# Altium integrated library Transistor-SMD_V2.IntLib: 415 symbols (part 1 of 2) (continued)
## CSD16414Q5_SON8 (continued)

## CSD17313Q2_SON6
designator Q?, comment CSD17313Q2
FET N-Channel 34A 25V; Manufacturer: Texas; Package: SON6-2x2-EP2; EDM-PN: *; Text2: *; Text1: *; Value: CSD17313Q2; SAAB PN: *; Part Number: CSD17313Q2; DCE Part No: *
footprint SON6-2x2-EP2 (SON6 2.0x2.0mm)
pins: 1 D, 2 D, 3 G, 4 S, 5 D, 6 D, 7 S, 8 D

## CSD17551Q3A_VSONP8
designator Q?, comment CSD17551Q3A
FET N-Channel 12A 30V; Manufacturer: Texas; Package: VSONP8-3x3-DNH; EDM-PN: *; Text2: *; Text1: *; Value: CSD17551Q3A; SAAB PN: *; Part Number: CSD17551Q3A; DCE Part No: *
footprint VSONP8-3x3-DNH (VSONP8 8 3.0x3.0mm)
pins: 1 S, 2 S, 3 S, 4 G, 5 D, 6 D, 7 D, 8 D, 9 D

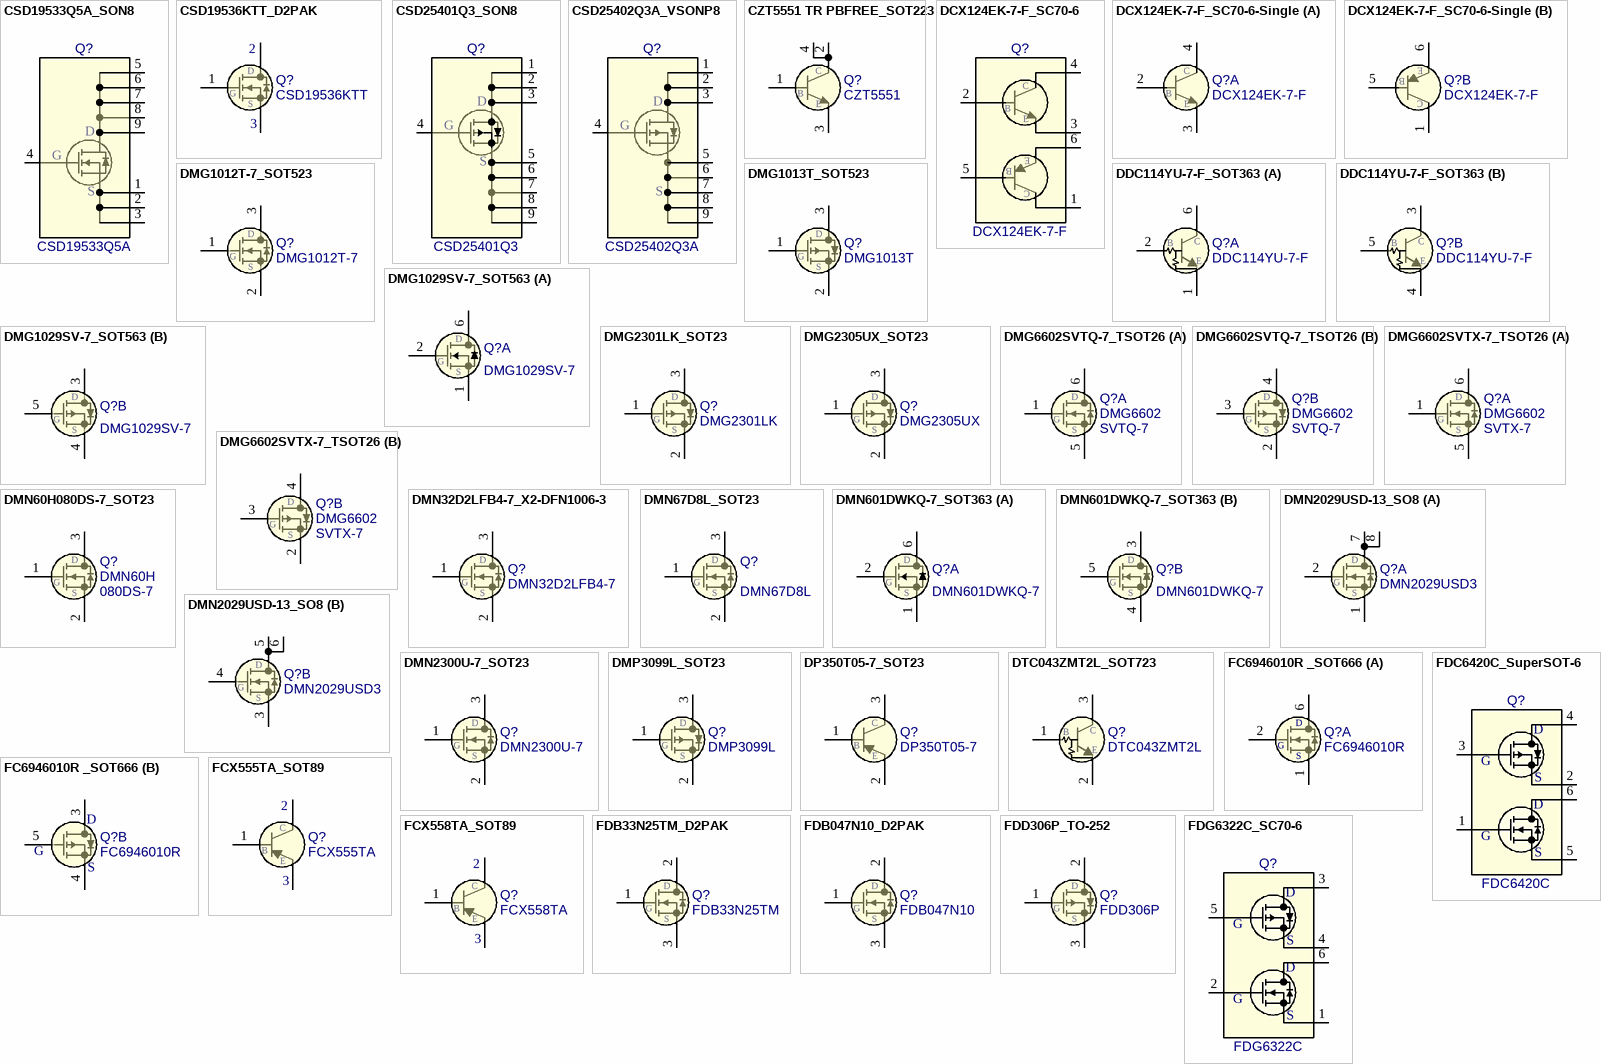
[diagram p3: symbols CSD19533Q5A_SON8 to FDG6322C_SC70-6]

## CSD19533Q5A_SON8
designator Q?, comment CSD19533Q5A
FET N-Channel 13A 100V; Manufacturer: Texas; Package: SON8-6x5-EP; EDM-PN: *; Text2: *; Text1: *; Value: CSD19533Q5A; SAAB PN: *; Part Number: CSD19533Q5A; DCE Part No: *
footprint SON8-5x6-EP (SON 8 6.1x5.1mm)
pins: 1 S, 2 S, 3 S, 4 G, 5 D, 6 D, 7 D, 8 D, 9 D

## CSD19536KTT_D2PAK
designator Q?, comment CSD19536KTT
FET N-Channel 200A 100V; Manufacturer: Texas; Reutech PN: 5961-FE-0102; Package: D2PAK; EDM-PN: *; Text2: *; Text1: *; Value: CSD19536KTT; SAAB PN: *; Part Number: CSD19536KTT; DCE Part No: *
footprint TO-263-KTT (TO-263, 3-Pads, Body 9.4x10.4mm (max), IPC Medium Density)
pins: 1 G, 2 D, 3 S

## CSD25401Q3_SON8
designator Q?, comment CSD25401Q3
FET P-Channel 14A 20V; Manufacturer: Texas; Package: SON8-3.3x3.3-EP; EDM-PN: *; Text2: *; Text1: *; Value: CSD25401Q3; SAAB PN: *; Part Number: CSD25401Q3; DCE Part No: *
footprint SON8-3.3x3.3-EP (SON 8 3.3x3.3mm)
pins: 1 S, 2 S, 3 S, 4 G, 5 D, 6 D, 7 D, 8 D, 9 D

## CSD25402Q3A_VSONP8
designator Q?, comment CSD25402Q3A
FET P-Channel 76A 20V; Manufacturer: Texas; Package: VSONP8-3x3-DNH; EDM-PN: *; Text2: *; Text1: *; Value: CSD25402Q3A; SAAB PN: *; Part Number: CSD25402Q3A; DCE Part No: *
footprint VSONP8-3x3-DNH (VSONP8 8 3.0x3.0mm)
pins: 1 D, 2 D, 3 D, 4 G, 5 S, 6 S, 7 S, 8 S, 9 S

## CZT5551 TR PBFREE_SOT223
designator Q?, comment value CZT5551  (hidden comment: CZT5551 TR PBFREE)
Transistor NPN 160V 600mA; Manufacturer: Central Semi; Package: SOT223; EDM-PN: *; Text2: *; Text1: *; SAAB PN: *; Part Number: CZT5551 TR PBFREE; DCE Part No: *
footprint SOT223 (SOT223, 4-Leads, Body 6.7x7.3mm (max), Pitch 2.30mm, IPC Medium Density)
pins: 1 B, 2 C, 3 E, 4 C

## DCX124EK-7-F_SC70-6
designator Q?, comment DCX124EK-7-F
Transistor NPN/PNP Prebias 0.1A 50V; Manufacturer: Diodes; Package: SC74-6-REV; EDM-PN: *; Text2: *; Text1: *; Value: DCX124EK-7-F; SAAB PN: *; Part Number: DCX124EK-7-F; DCE Part No: *
footprint SC74-6-REV (SC74-6 1.7x3.1mm)
pins: 1, 2, 3, 4, 5, 6
text: C; B; E

## DCX124EK-7-F_SC70-6-Single
designator Q?, comment DCX124EK-7-F
Transistor NPN/PNP Prebias 0.1A 50V; Manufacturer: Diodes; Package: SC70-6-REV; EDM-PN: *; Text2: *; Text1: *; Value: DCX124EK-7-F; SAAB PN: *; Part Number: DCX124EK-7-F; DCE Part No: *
footprint SC74-6-REV (SC74-6 1.7x3.1mm)
part A pins: 2, 3, 4
part B pins: 1, 5, 6
part A text: C; B; E
part B text: E; B; C

## DDC114YU-7-F_SOT363
designator Q?, comment DDC114YU-7-F
Transistor Dual NPN Prebias 50V 200mA 10K-47K; Manufacturer: Diodes; Package: SOT363-6-D; EDM-PN: *; Text2: *; Text1: *; Value: DDC114YU-7-F; SAAB PN: *; Part Number: DDC114YU-7-F; DCE Part No: *
footprint SOT363-6-D (SOT363 1.35x2.2mm 6lead)
part A pins: 1 E1, 2 B1, 6 C1
part B pins: 3 C2, 4 E2, 5 B2
part A text: B; C; E
part B text: B; C; E

## DMG1012T-7_SOT523
designator Q?, comment DMG1012T-7
FET N-Channel 20V 450mA; Manufacturer: Diodes Inc; Package: SOT523; EDM-PN: *; Text2: *; Text1: *; Value: DMG1012T-7; SAAB PN: *; Part Number: DMG1012T-7; DCE Part No: *
footprint SOT523 (SOT523 1.7x0.85mm)
pins: 1 G, 2 S, 3 D

## DMG1013T_SOT523
designator Q?, comment DMG1013T
FET P-Channel 20V 400mA; Manufacturer: Diodes Inc; Package: SOT523; EDM-PN: *; Text2: *; Text1: *; Value: DMG1013T; Part Number: DMG1013T; SAAB PN: *; DCE Part No: *
footprint SOT523 (SOT523 1.7x0.85mm)
pins: 1 G, 2 S, 3 D

## DMG1029SV-7_SOT563
designator Q?, comment DMG1029SV-7
FET Dual N/P-Channel 60V 500/360mA; Manufacturer: Diodes; Package: SOT563-6; EDM-PN: *; Text2: *; Text1: *; Part Number: DMG1029SV-7; SAAB PN: *; Value: DMG1029SV-7; DCE Part No: *
footprint SOT563-6 (SOT563-6 1.2x1.6mm)
part A pins: 1 S1, 2 G1, 6 D1
part B pins: 3 D2, 4 S2, 5 G2
part A text: D; G; S
part B text: D; G; S

## DMG2301LK_SOT23
designator Q?, comment DMG2301LK
FET P-Channel 20V 2.4A; Manufacturer: Diodes; Package: SOT23; EDM-PN: *; Text2: *; Text1: *; Value: DMG2301LK; SAAB PN: *; Part Number: DMG2301LK; DCE Part No: *
footprint SOT23 (SOT23, 3-Leads, Body 3.0x1.4mm (max), Pitch 0.95mm, IPC Medium Density)
pins: 1 G, 2 S, 3 D

## DMG2305UX_SOT23
designator Q?, comment DMG2305UX
FET P-Channel 3.6A 20V; Manufacturer: Diodes; Package: SOT23; EDM-PN: *; Text2: *; Text1: *; Value: DMG2305UX; SAAB PN: *; Part Number: DMG2305UX; DCE Part No: *
footprint SOT23 (SOT23, 3-Leads, Body 3.0x1.4mm (max), Pitch 0.95mm, IPC Medium Density)
pins: 1 G, 2 S, 3 D

## DMG6602SVTQ-7_TSOT26
designator Q?, comment Text2: SVTQ-7  Text1: DMG6602  (hidden comment: DMG6602SVTQ-7)
FET Dual N & P-Channel 30V 3.4/2.8A; Manufacturer: Diodes; Package: TSOT26; EDM-PN: *; Value: DMG6602SVTQ-7; SAAB PN: *; Part Number: DMG6602SVTQ-7; DCE Part No: *
footprint TSOT26 (TSOT26, 6-Leads, 1.6x2.9mm)
part A pins: 1 G1, 5 S1, 6 D1
part B pins: 2 S2, 3 G2, 4 D2
part A text: D; G; S
part B text: D; G; S

## DMG6602SVTX-7_TSOT26
designator Q?, comment Text2: SVTX-7  Text1: DMG6602  (hidden comment: DMG6602SVTX-7)
FET Dual N & P-Channel 30V 3.4/2.8A Complementary; Manufacturer: Diodes; Package: TSOT26; EDM-PN: *; Value: DMG6602SVTX-7; SAAB PN: *; Part Number: DMG6602SVTX-7; DCE Part No: *
footprint TSOT26 (TSOT26, 6-Leads, 1.6x2.9mm)
part A pins: 1 G1, 5 S1, 6 D1
part B pins: 2 S2, 3 G2, 4 D2
part A text: D; G; S
part B text: D; G; S

## DMN32D2LFB4-7_X2-DFN1006-3
designator Q?, comment DMN32D2LFB4-7
FET N-Channel 30V 300mA; Manufacturer: Diodes; Package: X2-DFN1006-3; EDM-PN: *; Text2: *; Text1: *; Value: DMN32D2LFB4-7; SAAB PN: *; DCE Part No: *; Part Number: DMN32D2LFB4-7
footprint X2-DFN1006-3 (DFN1006-3 0.6x1.0mm)
pins: 1 G, 2 S, 3 D

## DMN60H080DS-7_SOT23
designator Q?, comment Text2: 080DS-7  Text1: DMN60H  (hidden comment: DMN60H080DS-7)
FET N-Channel 600V 80mA; Manufacturer: Diodes; Package: SOT23; EDM-PN: *; Value: DMN60H080DS-7; SAAB PN: *; Part Number: DMN60H080DS-7; DCE Part No: *
footprint SOT23 (SOT23, 3-Leads, Body 3.0x1.4mm (max), Pitch 0.95mm, IPC Medium Density)
pins: 1 G, 2 S, 3 D

## DMN67D8L_SOT23
designator Q?, comment DMN67D8L
FET N-Channel 60V 210mA; Manufacturer: Diodes; Package: SOT23; EDM-PN: *; SAAB PN: *; Part Number: DMN67D8L; Text2: *; Text1: *; Value: DMN67D8L; DCE Part No: *
footprint SOT23 (SOT23, 3-Leads, Body 3.0x1.4mm (max), Pitch 0.95mm, IPC Medium Density)
pins: 1 G, 2 S, 3 D

## DMN601DWKQ-7_SOT363
designator Q?, comment DMN601DWKQ-7
FET Dual N-Channel 60V 305mA; Manufacturer: Diodes; Package: SOT363-6; EDM-PN: *; Text2: *; Text1: *; Part Number: DMN601DWKQ-7; SAAB PN: *; DCE Part No: *; Value: DMN601DWKQ-7
footprint SOT363-6 (SOT363 1.35x2.2mm 6lead)
part A pins: 1 S1, 2 G1, 6 D1
part B pins: 3 D2, 4 S2, 5 G2
part A text: D; G; S
part B text: D; G; S

## DMN2029USD-13_SO8
designator Q?, comment value DMN2029USD3  (hidden comment: DMN2029USD-13)
FET Dual N-Channel 20V 4.8A; Manufacturer: Diodes; Package: SO8; EDM-PN: *; Text2: *; Text1: *; SAAB PN: *; Part Number: DMN2029USD-13; DCE Part No: *
footprint SO8 (SOIC, 8-Leads, Body 5.0x4.0mm (max), Pitch 1.27mm, IPC Medium Density)
part A pins: 1 S1, 2 G1, 7 D1, 8 D2
part B pins: 3 S2, 4 G2, 5 D2, 6 D2
part A text: D; G; S
part B text: D; G; S

## DMN2300U-7_SOT23
designator Q?, comment DMN2300U-7
FET N-Channel 1.24A 20V; Manufacturer: Diodes; Package: SOT23; EDM-PN: *; Text2: *; Text1: *; Value: DMN2300U-7; SAAB PN: *; Part Number: DMN2300U-7; DCE Part No: *
footprint SOT23 (SOT23, 3-Leads, Body 3.0x1.4mm (max), Pitch 0.95mm, IPC Medium Density)
pins: 1 G, 2 S, 3 D

## DMP3099L_SOT23
designator Q?, comment DMP3099L
FET P-Channel 3.0A 30V; Manufacturer: Diodes; Package: SOT23; EDM-PN: *; Text2: *; Text1: *; Value: DMP3099L; SAAB PN: *; Part Number: DMP3099L; DCE Part No: *
footprint SOT23 (SOT23, 3-Leads, Body 3.0x1.4mm (max), Pitch 0.95mm, IPC Medium Density)
pins: 1 G, 2 S, 3 D

## DP350T05-7_SOT23
designator Q?, comment DP350T05-7
Transistor PNP 350V 500mA; Manufacturer: Diodes; Package: SOT23; EDM-PN: *; Text2: *; Text1: *; SAAB PN: *; Part Number: DP350T05-7; Value: DP350T05-7; DCE Part No: *
footprint SOT23 (SOT23, 3-Leads, Body 3.0x1.4mm (max), Pitch 0.95mm, IPC Medium Density)
pins: 1 B, 2 E, 3 C

## DTC043ZMT2L_SOT723
designator Q?, comment DTC043ZMT2L
Transistor NPN Prebias 50V 100mA 4K7-47K; Manufacturer: ROHM; Package: SOT723; EDM-PN: *; Text2: *; Text1: *; Value: DTC043ZMT2L; SAAB PN: *; Part Number: DTC043ZMT2L; DCE Part No: *
footprint SOT723 (SOT723 1.2x0.8mm)
pins: 1 G, 2 S, 3 D
text: B; C; E

## FC6946010R _SOT666
designator Q?, comment FC6946010R
FET N-Channel Dual 100mA 60V; Manufacturer: Panasonic; Package: SOT666; EDM-PN: *; Text2: *; Text1: *; Value: FC6946010R; SAAB PN: *; Part Number: FC6946010R; DCE Part No: *
footprint SOT666 (SOT666 1.3x1.7mm)
part A pins: 1 S-1, 2 G-1, 6 D-1
part B pins: 3 D-2, 4 S-2, 5 G-2
part A text: D; G; S
part B text: D; G; S

## FCX555TA_SOT89
designator Q?, comment FCX555TA
Transistor PNP High Voltage; Manufacturer: Zetex; Reutech PN: 5961-PN-0030; Package: SOT89; EDM-PN: *; Text2: *; Text1: *; Value: FCX555TA; SAAB PN: *; Part Number: FCX555TA; DCE Part No: *
footprint SOT89 (SOT89 4.5x2.45mm)
pins: 1 B, 2 C, 3 E

## FCX558TA_SOT89
designator Q?, comment FCX558TA
Transistor PNP High Voltage 200mA 400V; Manufacturer: Zetex; Package: SOT89; EDM-PN: *; Text2: *; Text1: *; Value: FCX558TA; Reutech PN: *; SAAB PN: *; Part Number: FCX558TA; DCE Part No: *
footprint SOT89 (SOT89 4.5x2.45mm)
pins: 1 B, 2 C, 3 E

## FDB33N25TM_D2PAK
designator Q?, comment FDB33N25TM
FET N-Channel 33A 250V; Manufacturer: Fairchild; Package: D2PAK; EDM-PN: *; Text2: *; Text1: *; Value: FDB33N25TM; SAAB PN: *; Part Number: FDB33N25TM; DCE Part No: *
footprint D2PAK (D2-PAK, 3-Pads, Body 9.4x10.4mm (max), IPC Medium Density)
pins: 1 G, 2 D, 3 S

## FDB047N10_D2PAK
designator Q?, comment FDB047N10
FET N-Channel 164A 100V; Manufacturer: Fairchild; Package: D2PAK; EDM-PN: *; Text2: *; Text1: *; Value: FDB047N10; SAAB PN: *; Part Number: FDB047N10; DCE Part No: *
footprint D2PAK (D2-PAK, 3-Pads, Body 9.4x10.4mm (max), IPC Medium Density)
pins: 1 G, 2 D, 3 S

## FDC6420C_SuperSOT-6
designator Q?, comment FDC6420C
FET N & P-Channel 2.2A 20V; Manufacturer: Fairchild; Package: SuperSOT-6; EDM-PN: *; Text2: *; Text1: *; Value: FDC6420C; SAAB PN: *; Part Number: FDC6420C; DCE Part No: *
footprint SUPERSOT-6 (SuperSot-6 1.7X3.0mm)
pins: 1 G-2, 2 S-1, 3 G-1, 4 D-1, 5 S-2, 6 D-2
text: D; G; S

## FDD306P_TO-252
designator Q?, comment FDD306P
FET P-Channel 6.7A 12V; Manufacturer: Fairchild; Package: TO-252; EDM-PN: *; Text2: *; Text1: *; Value: FDD306P; SAAB PN: *; Part Number: FDD306P; DCE Part No: *
footprint TO-252 (TO-252 6.58x6.1mm)
pins: 1 G, 2 D, 3 S

## FDG6322C_SC70-6
designator Q?, comment FDG6322C
FET N & P-Channel 0.2/0.4A 25V; Manufacturer: Fairchild; Package: SC70-6; EDM-PN: *; Text2: *; Text1: *; Value: FDG6322C; SAAB PN: *; Part Number: FDG6322C; DCE Part No: *
footprint SC70-6 (SC70, 6-Leads, Body 2.2x1.4mm (max), Pitch 0.65mm, IPC Medium Density)
pins: 1 S-1, 2 G-1, 3 D-2, 4 S-2, 5 G-2, 6 D-1
text: D; G; S

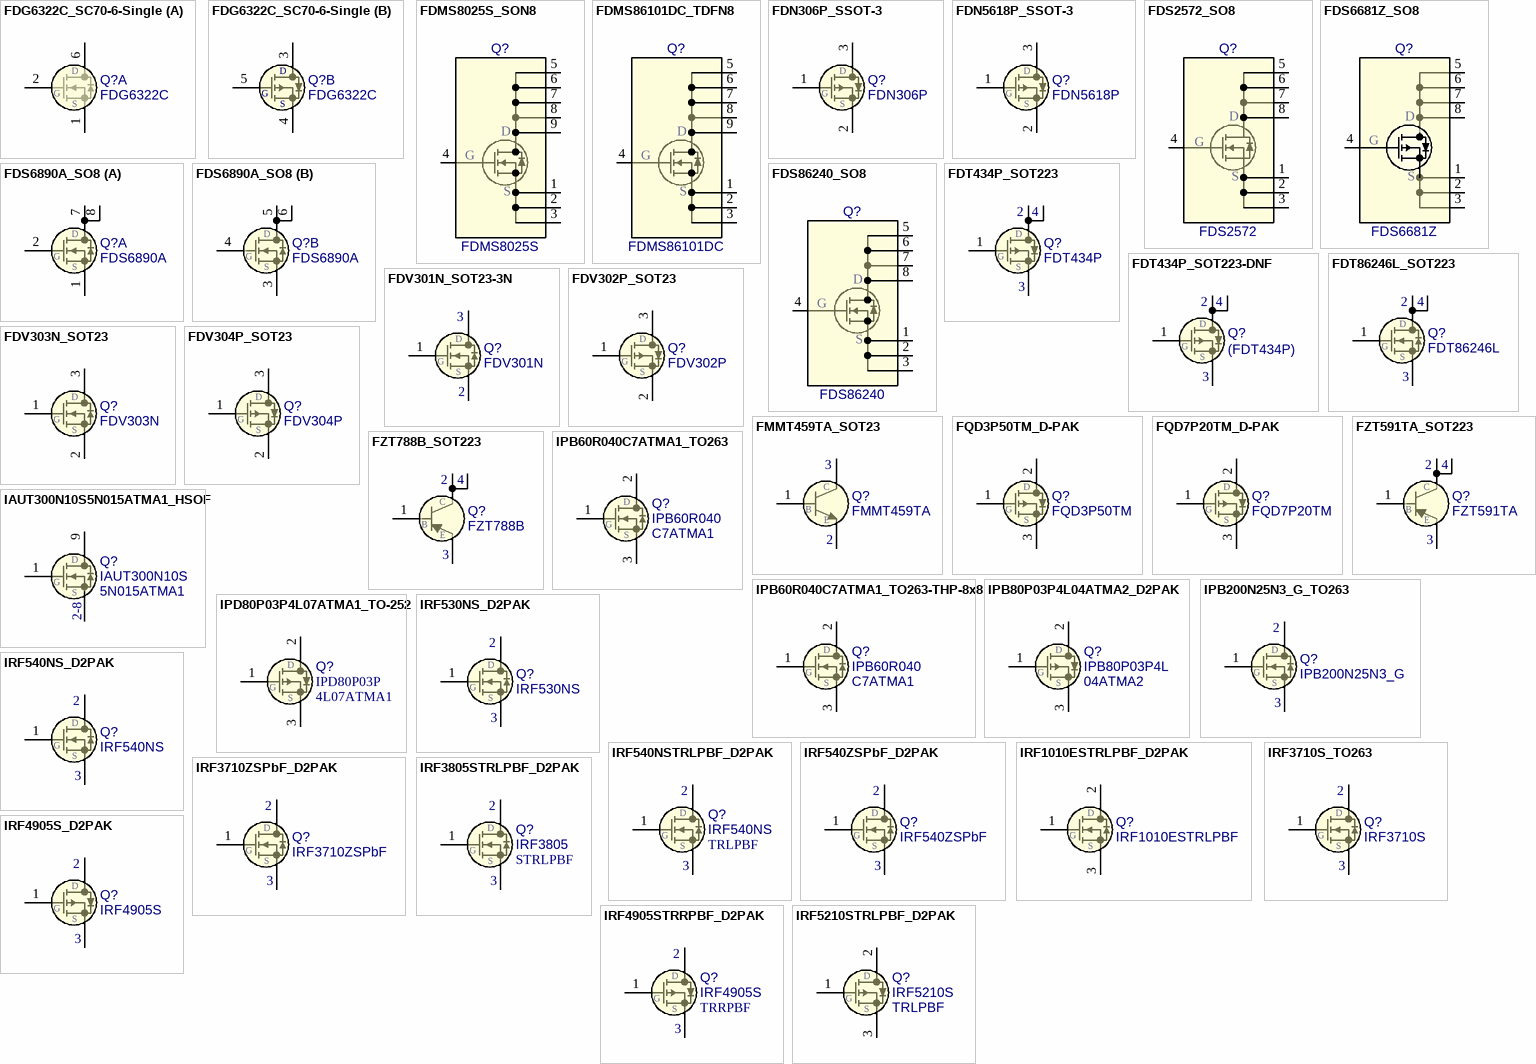
[diagram p4: symbols FDG6322C_SC70-6-Single to IRF5210STRLPBF_D2PAK]

## FDG6322C_SC70-6-Single
designator Q?, comment FDG6322C
FET N & P-Channel 0.2/0.4A 25V; Manufacturer: Fairchild; Package: SC70-6; EDM-PN: *; Text2: *; Text1: *; Value: FDG6322C; SAAB PN: *; Part Number: FDG6322C; DCE Part No: *
footprint SC70-6 (SC70, 6-Leads, Body 2.2x1.4mm (max), Pitch 0.65mm, IPC Medium Density)
part A pins: 1 S-1, 2 G-1, 6 D-1
part B pins: 3 D-2, 4 S-2, 5 G-2
part A text: D; G; S
part B text: D; G; S

## FDMS8025S_SON8
designator Q?, comment FDMS8025S
FET N-Channel 49A 30V; Manufacturer: Fairchild; Package: SON8-6x5-EP; EDM-PN: *; Text2: *; Text1: *; Value: FDMS8025S; SAAB PN: *; Part Number: FDMS8025S; DCE Part No: *
footprint SON8-5x6-EP (SON 8 6.1x5.1mm)
pins: 1 S, 2 S, 3 S, 4 G, 5 D, 6 D, 7 D, 8 D, 9 D

## FDMS86101DC_TDFN8
designator Q?, comment FDMS86101DC
FET N-Channel 14.5A 100V; Manufacturer: Fairchild; EDM-PN: FET149; Package: TDFN8-6x5-POWER; Text2: *; Text1: *; Value: FDMS86101DC; SAAB PN: *; Part Number: FDMS86101DC; DCE Part No: *
footprint TDFN8-6x5-POWER (TDFN8-6x5-POWER 6.1x5.1mm)
pins: 1 S, 2 S, 3 S, 4 G, 5 D, 6 D, 7 D, 8 D, 9 D

## FDN306P_SSOT-3
designator Q?, comment FDN306P
FET P-Channel 2.6A 12V; Manufacturer: On Semi; EDM-PN: FET145; Package: SuperSOT-3; Text2: *; Text1: *; Value: FDN306P; SAAB PN: *; Part Number: FDN306P; DCE Part No: *
footprint SuperSOT-3 (SuperSot-3 2.92x2.4mm)
pins: 1 G, 2 S, 3 D

## FDN5618P_SSOT-3
designator Q?, comment FDN5618P
FET P-Channel 1.25A 60V; Manufacturer: Fairchild; Package: SuperSOT-3; EDM-PN: *; Text2: *; Text1: *; Value: FDN5618P; SAAB PN: *; Part Number: FDN5618P; DCE Part No: *
footprint SuperSOT-3 (SuperSot-3 2.92x2.4mm)
pins: 1 G, 2 S, 3 D

## FDS2572_SO8
designator Q?, comment FDS2572
FET N-Channel 4.9A 150V; Manufacturer: Fairchild; Package: SO8; EDM-PN: *; Text2: *; Text1: *; Value: FDS2572; SAAB PN: *; Part Number: FDS2572; DCE Part No: *
footprint SO8 (SOIC, 8-Leads, Body 5.0x4.0mm (max), Pitch 1.27mm, IPC Medium Density)
pins: 1 S, 2 S, 3 S, 4 G, 5 D, 6 D, 7 D, 8 D

## FDS6681Z_SO8
designator Q?, comment FDS6681Z
FET P-Channel 20A 30V; Manufacturer: Fairchild; Package: SO8; EDM-PN: *; Text2: *; Text1: *; Value: FDS6681Z; SAAB PN: *; Part Number: FDS6681Z; DCE Part No: *
footprint SO8 (SOIC, 8-Leads, Body 5.0x4.0mm (max), Pitch 1.27mm, IPC Medium Density)
pins: 1 S, 2 S, 3 S, 4 G, 5 D, 6 D, 7 D, 8 D

## FDS6890A_SO8
designator Q?, comment FDS6890A
FET Dual N-Channel 20V 7.5A; Manufacturer: On Semi; Package: SO8; EDM-PN: *; Text2: *; Text1: *; SAAB PN: *; Part Number: FDS6890A; Value: FDS6890A; DCE Part No: *
footprint SO8 (SOIC, 8-Leads, Body 5.0x4.0mm (max), Pitch 1.27mm, IPC Medium Density)
part A pins: 1 S1, 2 G1, 7 D1, 8 D2
part B pins: 3 S2, 4 G2, 5 D2, 6 D2
part A text: D; G; S
part B text: D; G; S

## FDS86240_SO8
designator Q?, comment FDS86240
FET N-Channel 7.5A 150V; Manufacturer: Fairchild; Package: SO8; EDM-PN: *; Text2: *; Text1: *; Value: FDS86240; SAAB PN: *; Part Number: FDS86240; DCE Part No: *
footprint SO8 (SOIC, 8-Leads, Body 5.0x4.0mm (max), Pitch 1.27mm, IPC Medium Density)
pins: 1 S, 2 S, 3 S, 4 G, 5 D, 6 D, 7 D, 8 D

## FDT434P_SOT223
designator Q?, comment FDT434P
FET P-Channel 5.5A 20V; Manufacturer: Fairchild; Package: SOT223; EDM-PN: *; Text2: *; Text1: *; Value: FDT434P; SAAB PN: *; Part Number: FDT434P; DCE Part No: *
footprint SOT223 (SOT223, 4-Leads, Body 6.7x7.3mm (max), Pitch 2.30mm, IPC Medium Density)
pins: 1 G, 2 D, 3 S, 4 D

## FDT434P_SOT223-DNF
designator Q?, comment value (FDT434P)  (hidden comment: FDT434P)
FET P-Channel 5.5A 20V - Do not Fit; Manufacturer: Fairchild; Part Number: DNF - FDT434P; Package: SOT223; EDM-PN: *; Text2: *; Text1: *; SAAB PN: *; DCE Part No: *
footprint SOT223 (SOT223, 4-Leads, Body 6.7x7.3mm (max), Pitch 2.30mm, IPC Medium Density)
pins: 1 G, 2 D, 3 S, 4 D

## FDT86246L_SOT223
designator Q?, comment FDT86246L
FET N-Channel 150V 2Amp; Manufacturer: On Semi; Package: SOT223; EDM-PN: *; Text2: *; Text1: *; Value: FDT86246L; SAAB PN: *; Part Number: FDT86246L; DCE Part No: *
footprint SOT223 (SOT223, 4-Leads, Body 6.7x7.3mm (max), Pitch 2.30mm, IPC Medium Density)
pins: 1 G, 2 D, 3 S, 4 D

## FDV301N_SOT23-3N
designator Q?, comment FDV301N
FET N-Channel 220mA 25V; Manufacturer: Fairchild; Package: SOT23; EDM-PN: *; Text2: *; Text1: *; Value: FDV301N; SAAB PN: *; Part Number: FDV301N; DCE Part No: *
footprint SOT23 (SOT23, 3-Leads, Body 3.0x1.4mm (max), Pitch 0.95mm, IPC Medium Density)
pins: 1 G, 2 S, 3 D

## FDV302P_SOT23
designator Q?, comment FDV302P
FET P-Channel 120mA 25V; Manufacturer: Fairchild; Package: SOT23; EDM-PN: *; Text2: *; Text1: *; Value: FDV302P; SAAB PN: *; Part Number: FDV302P; DCE Part No: *
footprint SOT23 (SOT23, 3-Leads, Body 3.0x1.4mm (max), Pitch 0.95mm, IPC Medium Density)
pins: 1 G, 2 S, 3 D

## FDV303N_SOT23
designator Q?, comment FDV303N
FET N-Channel 680mA 25V; Manufacturer: Fairchild; EDM-PN: FET117; Package: SOT23; Text2: *; Text1: *; Value: FDV303N; SAAB PN: *; Part Number: FDV303N; DCE Part No: *
footprint SOT23 (SOT23, 3-Leads, Body 3.0x1.4mm (max), Pitch 0.95mm, IPC Medium Density)
pins: 1 G, 2 S, 3 D

## FDV304P_SOT23
designator Q?, comment FDV304P
FET P-Channel 460mA 25V; Manufacturer: Fairchild; EDM-PN: FET144; Package: SOT23; Text2: *; Text1: *; Value: FDV304P; SAAB PN: *; Part Number: FDV304P; DCE Part No: *
footprint SOT23 (SOT23, 3-Leads, Body 3.0x1.4mm (max), Pitch 0.95mm, IPC Medium Density)
pins: 1 G, 2 S, 3 D

## FMMT459TA_SOT23
designator Q?, comment FMMT459TA
Transistor NPN High Voltage 500V 150mA; Manufacturer: Zetex; Package: SOT23; EDM-PN: *; Text2: *; Text1: *; Value: FMMT459TA; SAAB PN: *; Part Number: FMMT459TA; DCE Part No: *
footprint SOT23 (SOT23, 3-Leads, Body 3.0x1.4mm (max), Pitch 0.95mm, IPC Medium Density)
pins: 1 B, 2 E, 3 C

## FQD3P50TM_D-PAK
designator Q?, comment FQD3P50TM
FET P-Channel 2.1A 500V; Manufacturer: On Semi; Package: D-PAK; EDM-PN: *; Text2: *; Text1: *; Value: FQD3P50TM; SAAB PN: *; Part Number: FQD3P50TM; DCE Part No: *
footprint D-PAK (D-Pak 6.73x6.22mm)
pins: 1 G, 2 D, 3 S

## FQD7P20TM_D-PAK
designator Q?, comment FQD7P20TM
FET P-Channel 5.7A 200V; Manufacturer: Fairchild; Package: D-PAK; EDM-PN: *; Text2: *; Text1: *; Value: FQD7P20TM; SAAB PN: *; Part Number: FQD7P20TM; DCE Part No: *
footprint D-PAK (D-Pak 6.73x6.22mm)
pins: 1 G, 2 D, 3 S

## FZT591TA_SOT223
designator Q?, comment FZT591TA
Transistor PNP Medium Power 1A 60V; Manufacturer: Diodes; Package: SOT223; Text2: *; Text1: *; Value: FZT591TA; Reutech PN: *; SAAB PN: *; Part Number: FZT591TA; DCE Part No: *
footprint SOT223 (SOT223, 4-Leads, Body 6.7x7.3mm (max), Pitch 2.30mm, IPC Medium Density)
pins: 1 G, 2 D, 3 S, 4 D
text: C; B; E

## FZT788B_SOT223
designator Q?, comment FZT788B
Transistor PNP Medium Power 3.0A 15V; Manufacturer: Diodes; Package: SOT223; Text2: *; Text1: *; Value: FZT788B; SAAB PN: *; Part Number: FZT788B; DCE Part No: *
footprint SOT223 (SOT223, 4-Leads, Body 6.7x7.3mm (max), Pitch 2.30mm, IPC Medium Density)
pins: 1 G, 2 D, 3 S, 4 D
text: C; B; E

## IAUT300N10S5N015ATMA1_HSOF
designator Q?, comment Text2: 5N015ATMA1  Text1: IAUT300N10S  (hidden comment: IAUT300N10S5N015ATMA1)
FET N-Channel 100V 300A; Manufacturer: Infineon; Reutech PN: 5961-FE-0107; Package: PG-HSOF-8-1; EDM-PN: *; Value: IAUT300N10S5N015ATMA1; SAAB PN: *; Part Number: IAUT300N10S5N015ATMA1; DCE Part No: *
footprint PG-HSOF-8-1 (PG-HSOF-8-1 9.9x11.675mm)
pins: 1 G, 2 S, 3 S, 4 S, 5 S, 6 S, 7 S, 8 S, 9 D
text: 2-8

## IPB60R040C7ATMA1_TO263
designator Q?, comment Text2: C7ATMA1  Text1: IPB60R040  (hidden comment: IPB60R040C7ATMA1)
FET N-Channel 650V 50A; Manufacturer: Infineon; Reutech PN: 5961-FE-0104; Package: TO-263; EDM-PN: *; Value: IPB60R040C7ATMA1; SAAB PN: *; Part Number: IPB60R040C7ATMA1; DCE Part No: *
footprint TO-263 (TO-263, 3-Pads, Body 9.4x10.4mm (max), IPC Medium Density)
pins: 1 G, 2 D, 3 S

## IPB60R040C7ATMA1_TO263-THP-8x8
designator Q?, comment Text2: C7ATMA1  Text1: IPB60R040  (hidden comment: IPB60R040C7ATMA1)
FET N-Channel 650V 50A; Manufacturer: Infineon; Reutech PN: 5961-FE-0104; Package: TO-263-THERM-HOLE-8x8; EDM-PN: *; Value: IPB60R040C7ATMA1; SAAB PN: *; Part Number: IPB60R040C7ATMA1; DCE Part No: *
footprint TO-263-THERM-HOLE-8x8 (TO-263, 3-Pads, Body 9.4x10.4mm (max), IPC Medium Density)
pins: 1 G, 2 D, 3 S

## IPB80P03P4L04ATMA2_D2PAK
designator Q?, comment Text2: 04ATMA2  Text1: IPB80P03P4L  (hidden comment: IPB80P03P4L04ATMA2)
FET P-Channel 30V 80A; Manufacturer: Infineon; Package: D2PAK; EDM-PN: *; SAAB PN: *; Part Number: IPB80P03P4L04ATMA2; Value: IPB80P03P4L04ATMA2; DCE Part No: *
footprint D2PAK (D2-PAK, 3-Pads, Body 9.4x10.4mm (max), IPC Medium Density)
pins: 1 G, 2 D, 3 S

## IPB200N25N3_G_TO263
designator Q?, comment IPB200N25N3_G
FET N-Channel 64A 250V; Manufacturer: Infineon; Package: TO-263; EDM-PN: *; Text2: *; Text1: *; Value: IPB200N25N3_G; SAAB PN: *; Part Number: IPB200N25N3_G; DCE Part No: *
footprint TO-263 (TO-263, 3-Pads, Body 9.4x10.4mm (max), IPC Medium Density)
pins: 1 G, 2 D, 3 S

## IPD80P03P4L07ATMA1_TO-252
designator Q?, comment Text2: 4L07ATMA1  Text1: IPD80P03P  (hidden comment: IPD80P03P4L07ATMA1)
FET P-Channel 6.7A 12V; Manufacturer: Infineon; Package: TO-252; EDM-PN: *; Value: IPD80P03P4L07ATMA1; SAAB PN: *; Part Number: IPD80P03P4L07ATMA1; DCE Part No: *
footprint TO-252 (TO-252 6.58x6.1mm)
pins: 1 G, 2 D, 3 S

## IRF530NS_D2PAK
designator Q?, comment IRF530NS
FET N-Channel 17A 100V; Manufacturer: IRF; Package: D2PAK; EDM-PN: *; Text2: *; Text1: *; Value: IRF530NS; SAAB PN: *; DCE Part No: *; Part Number: IRF530NS
footprint D2PAK (D2-PAK, 3-Pads, Body 9.4x10.4mm (max), IPC Medium Density)
pins: 1 G, 2 D, 3 S

## IRF540NS_D2PAK
designator Q?, comment IRF540NS
FET N-Channel 33A 100V; Manufacturer: IRF; Package: D2PAK; EDM-PN: *; Text2: *; Text1: *; Value: IRF540NS; SAAB PN: *; Part Number: IRF540NS; DCE Part No: *
footprint D2PAK (D2-PAK, 3-Pads, Body 9.4x10.4mm (max), IPC Medium Density)
pins: 1 G, 2 D, 3 S

## IRF540NSTRLPBF_D2PAK
designator Q?, comment Text2: TRLPBF  Text1: IRF540NS  (hidden comment: IRF540NSTRLPBF)
FET N-Channel 33A 100V; Manufacturer: Infineon; Package: D2PAK; EDM-PN: *; Value: IRF540NSTRLPBF; Part Number: IRF540NSTRLPBF; SAAB PN: *; DCE Part No: *
footprint D2PAK (D2-PAK, 3-Pads, Body 9.4x10.4mm (max), IPC Medium Density)
pins: 1 G, 2 D, 3 S

## IRF540ZSPbF_D2PAK
designator Q?, comment IRF540ZSPbF
FET N-Channel 36A 100V; Manufacturer: IRF; Package: D2PAK; EDM-PN: *; Text2: *; Text1: *; Value: IRF540ZSPbF; SAAB PN: *; Part Number: IRF540ZSPbF; DCE Part No: *
footprint D2PAK (D2-PAK, 3-Pads, Body 9.4x10.4mm (max), IPC Medium Density)
pins: 1 G, 2 D, 3 S

## IRF1010ESTRLPBF_D2PAK
designator Q?, comment IRF1010ESTRLPBF
FET N-Channel 60V 84A; Manufacturer: Infineon; Value: FDB33N25TMIRF1010ESTRLPBF; Package: D2PAK; EDM-PN: *; Text2: *; Text1: *; SAAB PN: *; Part Number: IRF1010ESTRLPBF; DCE Part No: *
footprint D2PAK (D2-PAK, 3-Pads, Body 9.4x10.4mm (max), IPC Medium Density)
pins: 1 G, 2 D, 3 S

## IRF3710S_TO263
designator Q?, comment IRF3710S
FET N-Channel 46A 100V; Manufacturer: IRF; Package: TO-263; EDM-PN: *; Text2: *; Text1: *; Value: IRF3710S; SAAB PN: *; Part Number: IRF3710S; DCE Part No: *
footprint TO-263 (TO-263, 3-Pads, Body 9.4x10.4mm (max), IPC Medium Density)
pins: 1 G, 2 D, 3 S

## IRF3710ZSPbF_D2PAK
designator Q?, comment IRF3710ZSPbF
FET N-Channel 59A 100V; Manufacturer: IRF; Package: D2PAK; EDM-PN: *; Text2: *; Text1: *; Value: IRF3710ZSPbF; SAAB PN: *; Part Number: IRF3710ZSPbF; DCE Part No: *
footprint D2PAK (D2-PAK, 3-Pads, Body 9.4x10.4mm (max), IPC Medium Density)
pins: 1 G, 2 D, 3 S

## IRF3805STRLPBF_D2PAK
designator Q?, comment Text1: IRF3805  Text2: STRLPBF  (hidden comment: IRF3805STRLPBF)
FET N-Channel 75A 55V; Manufacturer: IRF; Package: D2PAK; EDM-PN: *; Value: IRF3805STRLPBF; Part Number: IRF3805STRLPBF; SAAB PN: *; DCE Part No: *
footprint D2PAK (D2-PAK, 3-Pads, Body 9.4x10.4mm (max), IPC Medium Density)
pins: 1 G, 2 D, 3 S

## IRF4905S_D2PAK
designator Q?, comment IRF4905S
FET P-Channel 74A 55V; Manufacturer: IRF; Package: D2PAK; EDM-PN: *; Text2: *; Text1: *; Value: IRF4905S; SAAB PN: *; Part Number: IRF4905S; DCE Part No: *
footprint D2PAK (D2-PAK, 3-Pads, Body 9.4x10.4mm (max), IPC Medium Density)
pins: 1 G, 2 D, 3 S

## IRF4905STRRPBF_D2PAK
designator Q?, comment Text2: TRRPBF  Text1: IRF4905S  (hidden comment: IRF4905STRRPBF)
FET P-Channel 70A 55V; Manufacturer: IRF; Reutech PN: 5961-FE-0103; Package: D2PAK; EDM-PN: *; Value: IRF4905STRRPBF; SAAB PN: *; Part Number: IRF4905STRRPBF; DCE Part No: *
footprint D2PAK (D2-PAK, 3-Pads, Body 9.4x10.4mm (max), IPC Medium Density)
pins: 1 G, 2 D, 3 S

## IRF5210STRLPBF_D2PAK
designator Q?, comment Text2: TRLPBF  Text1: IRF5210S  (hidden comment: IRF5210STRLPBF)
FET P-Channel 19A 100V; Manufacturer: Infineon; Package: D2PAK; EDM-PN: *; Value: IRF5210STRLPBF; SAAB PN: *; Part Number: IRF5210STRLPBF; DCE Part No: *
footprint D2PAK (D2-PAK, 3-Pads, Body 9.4x10.4mm (max), IPC Medium Density)
pins: 1 G, 2 D, 3 S

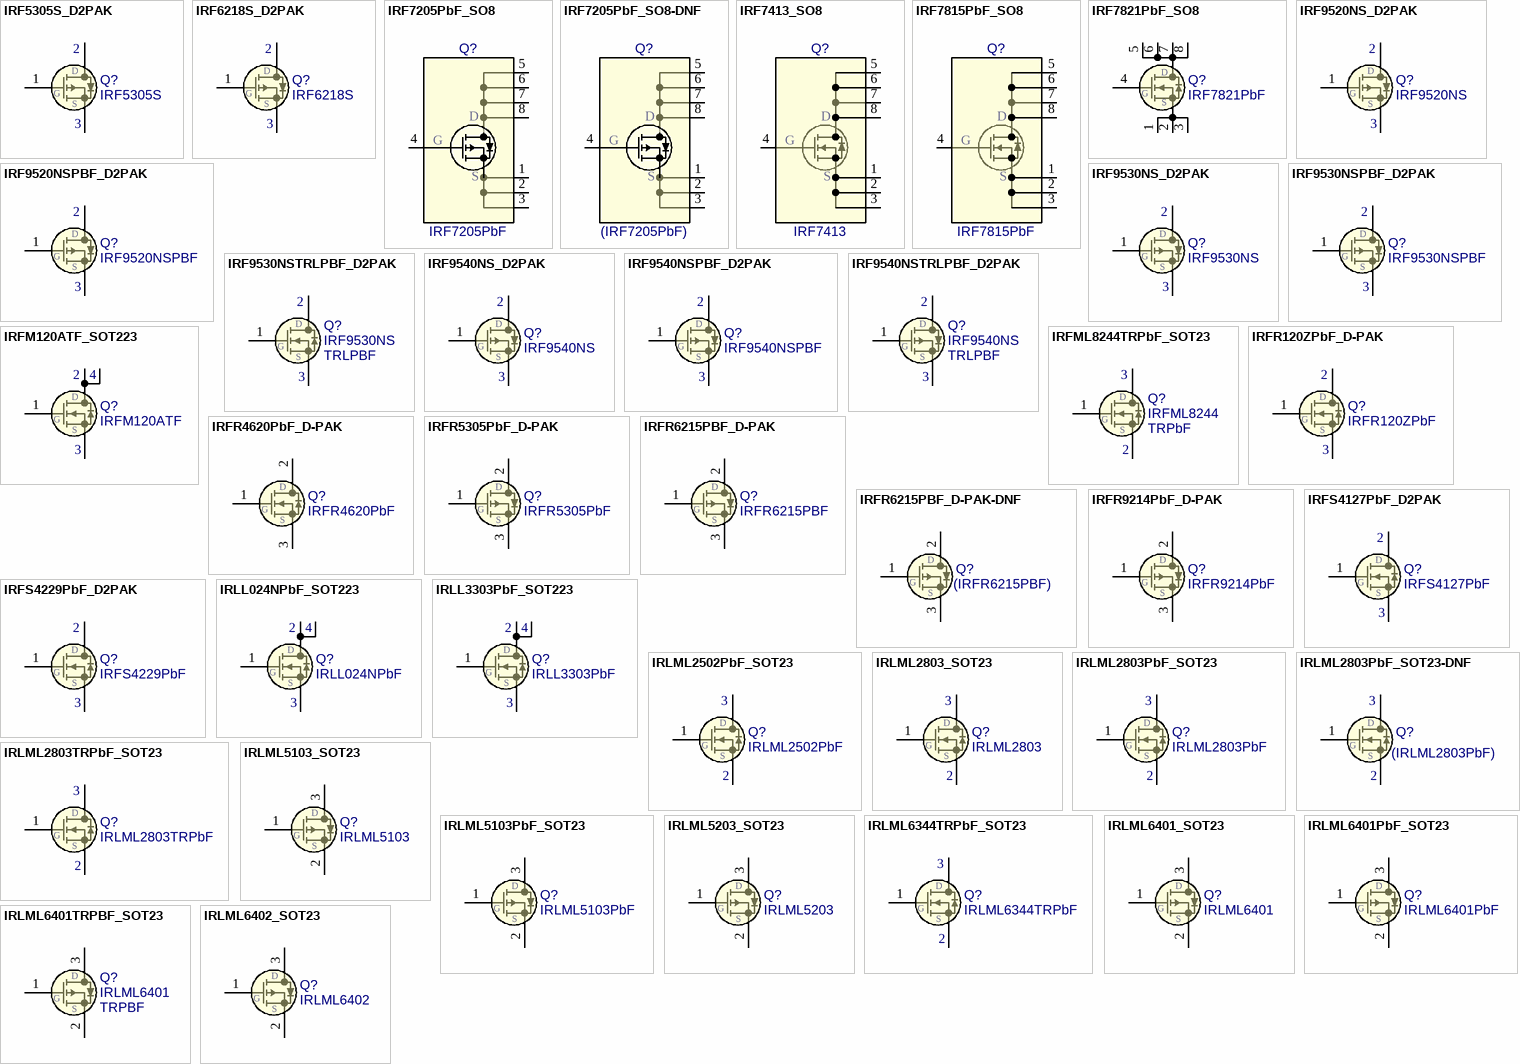
[diagram p5: symbols IRF5305S_D2PAK to IRLML6402_SOT23]

## IRF5305S_D2PAK
designator Q?, comment IRF5305S
FET P-Channel 31A 55V; Manufacturer: IRF; Package: D2PAK; EDM-PN: *; Text2: *; Text1: *; Value: IRF5305S; Part Number: IRF5305S; SAAB PN: *; DCE Part No: *
footprint D2PAK (D2-PAK, 3-Pads, Body 9.4x10.4mm (max), IPC Medium Density)
pins: 1 G, 2 D, 3 S

## IRF6218S_D2PAK
designator Q?, comment IRF6218S
FET P-Channel 27A 150V; Manufacturer: IRF; Package: D2PAK; EDM-PN: *; Text2: *; Text1: *; Value: IRF6218S; Part Number: IRF6218S; SAAB PN: *; DCE Part No: *
footprint D2PAK (D2-PAK, 3-Pads, Body 9.4x10.4mm (max), IPC Medium Density)
pins: 1 G, 2 D, 3 S

## IRF7205PbF_SO8
designator Q?, comment IRF7205PbF
FET P-Channel 4.6A 30V; Manufacturer: IRF; Package: SO8; EDM-PN: *; Text2: *; Text1: *; Value: IRF7205PbF; SAAB PN: *; Part Number: IRF7205PbF; DCE Part No: *
footprint SO8 (SOIC, 8-Leads, Body 5.0x4.0mm (max), Pitch 1.27mm, IPC Medium Density)
pins: 1 S, 2 S, 3 S, 4 G, 5 D, 6 D, 7 D, 8 D

## IRF7205PbF_SO8-DNF
designator Q?, comment value (IRF7205PbF)  (hidden comment: IRF7205PbF-DNF)
FET P-Channel 4.6A 30V  Do not Fit; Manufacturer: IRF; Part Number: DNF - IRF7205PbF; Package: SO8; EDM-PN: *; Text2: *; Text1: *; SAAB PN: *; DCE Part No: *
footprint SO8 (SOIC, 8-Leads, Body 5.0x4.0mm (max), Pitch 1.27mm, IPC Medium Density)
pins: 1 S, 2 S, 3 S, 4 G, 5 D, 6 D, 7 D, 8 D

## IRF7413_SO8
designator Q?, comment IRF7413
FET N-Channel 13A 30V; Manufacturer: IRF; Package: SO8; EDM-PN: *; Text2: *; Text1: *; Value: IRF7413; SAAB PN: *; Part Number: IRF7413; DCE Part No: *
footprint SO8 (SOIC, 8-Leads, Body 5.0x4.0mm (max), Pitch 1.27mm, IPC Medium Density)
pins: 1 S, 2 S, 3 S, 4 G, 5 D, 6 D, 7 D, 8 D

## IRF7815PbF_SO8
designator Q?, comment IRF7815PbF
FET N-Channel 4.1A 150V; Manufacturer: IRF; Package: SO8; EDM-PN: *; Text2: *; Text1: *; Value: IRF7815PbF; SAAB PN: *; Part Number: IRF7815PbF; DCE Part No: *
footprint SO8 (SOIC, 8-Leads, Body 5.0x4.0mm (max), Pitch 1.27mm, IPC Medium Density)
pins: 1 S, 2 S, 3 S, 4 G, 5 D, 6 D, 7 D, 8 D

## IRF7821PbF_SO8
designator Q?, comment IRF7821PbF
FET N-Channel 11A 30V; Manufacturer: IRF; Package: SO8; EDM-PN: *; Text2: *; Text1: *; Value: IRF7821PbF; SAAB PN: *; Part Number: IRF7821PbF; DCE Part No: *
footprint SO8 (SOIC, 8-Leads, Body 5.0x4.0mm (max), Pitch 1.27mm, IPC Medium Density)
pins: 1 S, 2 S, 3 S, 4 G, 5 D, 6 D, 7 D, 8 D

## IRF9520NS_D2PAK
designator Q?, comment IRF9520NS
FET P-Channel 6.8A 100V; Manufacturer: IRF; Package: D2PAK; EDM-PN: *; Text2: *; Text1: *; Value: IRF9520NS; SAAB PN: *; Part Number: IRF9520NS; DCE Part No: *
footprint D2PAK (D2-PAK, 3-Pads, Body 9.4x10.4mm (max), IPC Medium Density)
pins: 1 G, 2 D, 3 S

## IRF9520NSPBF_D2PAK
designator Q?, comment IRF9520NSPBF
FET P-Channel 6.8A 100V; Manufacturer: Infineon; Package: D2PAK; EDM-PN: *; Text2: *; Text1: *; Value: IRF9520NSPBF; SAAB PN: *; Part Number: IRF9520NSPBF; DCE Part No: *
footprint D2PAK (D2-PAK, 3-Pads, Body 9.4x10.4mm (max), IPC Medium Density)
pins: 1 G, 2 D, 3 S

## IRF9530NS_D2PAK
designator Q?, comment IRF9530NS
FET P-Channel 14A 100V; Manufacturer: IRF; Package: D2PAK; EDM-PN: *; Text2: *; Text1: *; Value: IRF9530NS; SAAB PN: *; Part Number: IRF9530NS; DCE Part No: *
footprint D2PAK (D2-PAK, 3-Pads, Body 9.4x10.4mm (max), IPC Medium Density)
pins: 1 G, 2 D, 3 S

## IRF9530NSPBF_D2PAK
designator Q?, comment IRF9530NSPBF
FET P-Channel 14A 100V; Manufacturer: Infineon; Package: D2PAK; EDM-PN: *; Text2: *; Text1: *; Value: IRF9530NSPBF; SAAB PN: *; Part Number: IRF9530NSPBF; DCE Part No: *
footprint D2PAK (D2-PAK, 3-Pads, Body 9.4x10.4mm (max), IPC Medium Density)
pins: 1 G, 2 D, 3 S

## IRF9530NSTRLPBF_D2PAK
designator Q?, comment Text2: TRLPBF  Text1: IRF9530NS  (hidden comment: IRF9530NSTRLPBF)
FET N-Channel 14A 100V; Manufacturer: Infineon; Package: D2PAK; EDM-PN: *; Value: IRF9530NSTRLPBF; SAAB PN: *; Part Number: IRF9530NSTRLPBF; DCE Part No: *
footprint D2PAK (D2-PAK, 3-Pads, Body 9.4x10.4mm (max), IPC Medium Density)
pins: 1 G, 2 D, 3 S

## IRF9540NS_D2PAK
designator Q?, comment IRF9540NS
FET P-Channel 100V 19A; Manufacturer: IRF; Package: D2PAK; EDM-PN: *; Text2: *; Text1: *; Value: IRF9540NS; SAAB PN: *; Part Number: IRF9540NS; DCE Part No: *
footprint D2PAK (D2-PAK, 3-Pads, Body 9.4x10.4mm (max), IPC Medium Density)
pins: 1 G, 2 D, 3 S

## IRF9540NSPBF_D2PAK
designator Q?, comment IRF9540NSPBF
FET P-Channel 100V 19A; Manufacturer: Infineon; Package: D2PAK; EDM-PN: *; Text2: *; Text1: *; Value: IRF9540NSPBF; SAAB PN: *; DCE Part No: *; Part Number: IRF9540NSPBF
footprint D2PAK (D2-PAK, 3-Pads, Body 9.4x10.4mm (max), IPC Medium Density)
pins: 1 G, 2 D, 3 S

## IRF9540NSTRLPBF_D2PAK
designator Q?, comment Text1: IRF9540NS  Text2: TRLPBF  (hidden comment: IRF9540NSTRLPBF)
FET P-Channel 100V 23A; Manufacturer: Infineon; DCE Part No: 10290; Package: D2PAK; EDM-PN: *; Value: IRF9540NSTRLPBF; SAAB PN: *; Part Number: IRF9540NSTRLPBF
footprint D2PAK (D2-PAK, 3-Pads, Body 9.4x10.4mm (max), IPC Medium Density)
pins: 1 G, 2 D, 3 S

## IRFM120ATF_SOT223
designator Q?, comment IRFM120ATF
FET N-Channel 2.3A 100V; Manufacturer: On Semi; Package: SOT223; EDM-PN: *; Text2: *; Text1: *; Value: IRFM120ATF; SAAB PN: *; Part Number: IRFM120ATF; DCE Part No: *
footprint SOT223 (SOT223, 4-Leads, Body 6.7x7.3mm (max), Pitch 2.30mm, IPC Medium Density)
pins: 1 G, 2 D, 3 S, 4 D

## IRFML8244TRPbF_SOT23
designator Q?, comment Text2: TRPbF  Text1: IRFML8244  (hidden comment: IRFML8244TRPbF)
FET N-Channel 5.8A 25V; Manufacturer: IRF; Package: SOT23; EDM-PN: *; Value: IRFML8244TRPbF; Part Number: IRFML8244TRPbF; SAAB PN: *; DCE Part No: *
footprint SOT23 (SOT23, 3-Leads, Body 3.0x1.4mm (max), Pitch 0.95mm, IPC Medium Density)
pins: 1 G, 2 S, 3 D

## IRFR120ZPbF_D-PAK
designator Q?, comment IRFR120ZPbF
FET N-Channel 8.7A 100V; Manufacturer: IRF; Package: D-PAK-3; EDM-PN: *; Text2: *; Text1: *; Value: IRFR120ZPbF; SAAB PN: *; Part Number: IRFR120ZPbF; DCE Part No: *
footprint D-PAK-3 (D-Pak 6.73x6.22mm)
pins: 1 G, 2 D, 3 S

## IRFR4620PbF_D-PAK
designator Q?, comment IRFR4620PbF
FET N-Channel 24A 200V; Manufacturer: Infineon; Package: D-PAK-3; EDM-PN: *; Text2: *; Text1: *; Value: IRFR4620PbF; SAAB PN: *; Part Number: IRFR4620PbF; DCE Part No: *
footprint D-PAK-3 (D-Pak 6.73x6.22mm)
pins: 1 G, 2 D, 3 S

## IRFR5305PbF_D-PAK
designator Q?, comment IRFR5305PbF
FET P-Channel 31A 55V; Manufacturer: IRF; Package: D-PAK; EDM-PN: *; Text2: *; Text1: *; Value: IRFR5305PbF; SAAB PN: *; Part Number: IRFR5305PbF; DCE Part No: *
footprint D-PAK (D-Pak 6.73x6.22mm)
pins: 1 G, 2 D, 3 S

## IRFR6215PBF_D-PAK
designator Q?, comment IRFR6215PBF
FET P-Channel 75mA 100V; Manufacturer: IRF; Package: D-PAK; EDM-PN: *; Text2: *; Text1: *; Value: IRFR6215PBF; SAAB PN: *; Part Number: IRFR6215PBF; DCE Part No: *
footprint D-PAK (D-Pak 6.73x6.22mm)
pins: 1 G, 2 D, 3 S

## IRFR6215PBF_D-PAK-DNF
designator Q?, comment value (IRFR6215PBF)  (hidden comment: IRFR6215PBF)
FET P-Channel 75mA 100V - Do not Fit; Manufacturer: IRF; Part Number: DNF - IRFR6215PBF; Package: D-PAK; EDM-PN: *; Text2: *; Text1: *; SAAB PN: *; DCE Part No: *
footprint D-PAK (D-Pak 6.73x6.22mm)
pins: 1 G, 2 D, 3 S

## IRFR9214PbF_D-PAK
designator Q?, comment IRFR9214PbF
FET P-Channel 255V 2.7A; Manufacturer: IRF; Package: D-PAK; EDM-PN: *; Text2: *; Text1: *; Value: IRFR9214PbF; SAAB PN: *; Part Number: IRFR9214PbF; DCE Part No: *
footprint D-PAK (D-Pak 6.73x6.22mm)
pins: 1 G, 2 D, 3 S

## IRFS4127PbF_D2PAK
designator Q?, comment IRFS4127PbF
FET N-Channel 72A 200V; Manufacturer: IRF; Package: D2PAK; EDM-PN: *; Text2: *; Text1: *; Value: IRFS4127PbF; Part Number: IRFS4127PbF; SAAB PN: *; DCE Part No: *
footprint D2PAK (D2-PAK, 3-Pads, Body 9.4x10.4mm (max), IPC Medium Density)
pins: 1 G, 2 D, 3 S

## IRFS4229PbF_D2PAK
designator Q?, comment IRFS4229PbF
FET N-Channel 91A 250V; Manufacturer: IRF; Package: D2PAK; EDM-PN: *; Text2: *; Text1: *; Value: IRFS4229PbF; SAAB PN: *; Part Number: IRFS4229PbF; DCE Part No: *
footprint D2PAK (D2-PAK, 3-Pads, Body 9.4x10.4mm (max), IPC Medium Density)
pins: 1 G, 2 D, 3 S

## IRLL024NPbF_SOT223
designator Q?, comment IRLL024NPbF
FET N-Channel 3.1A 55V; Manufacturer: IRF; Package: SOT223; EDM-PN: *; Text2: *; Text1: *; Value: IRLL024NPbF; SAAB PN: *; DCE Part No: *; Part Number: IRLL024NPbF
footprint SOT223 (SOT223, 4-Leads, Body 6.7x7.3mm (max), Pitch 2.30mm, IPC Medium Density)
pins: 1 G, 2 D, 3 S, 4 D

## IRLL3303PbF_SOT223
designator Q?, comment IRLL3303PbF
FET N-Channel 4.6A 30V; Manufacturer: IRF; Package: SOT223; EDM-PN: *; Text2: *; Text1: *; Value: IRLL3303PbF; Part Number: IRLL3303PbF; SAAB PN: *; DCE Part No: *
footprint SOT223 (SOT223, 4-Leads, Body 6.7x7.3mm (max), Pitch 2.30mm, IPC Medium Density)
pins: 1 G, 2 D, 3 S, 4 D

## IRLML2502PbF_SOT23
designator Q?, comment IRLML2502PbF
FET N-Channel 3.4A 20V; Manufacturer: IRF; Package: SOT23; EDM-PN: *; Text2: *; Text1: *; Value: IRLML2502PbF; SAAB PN: *; DCE Part No: *; Part Number: IRLML2502PbF
footprint SOT23 (SOT23, 3-Leads, Body 3.0x1.4mm (max), Pitch 0.95mm, IPC Medium Density)
pins: 1 G, 2 S, 3 D

## IRLML2803_SOT23
designator Q?, comment IRLML2803
FET N-Channel 1.2A 30V; Manufacturer: IRF; EDM-PN: FET1; Package: SOT23; Text2: *; Text1: *; Value: IRLML2803; SAAB PN: *; DCE Part No: *; Part Number: IRLML2803
footprint SOT23 (SOT23, 3-Leads, Body 3.0x1.4mm (max), Pitch 0.95mm, IPC Medium Density)
pins: 1 G, 2 S, 3 D

## IRLML2803PbF_SOT23
designator Q?, comment IRLML2803PbF
FET N-Channel 1.2A 30V; Manufacturer: IRF; EDM-PN: FET1; Package: SOT23; Text2: *; Text1: *; Value: IRLML2803PbF; SAAB PN: *; Part Number: IRLML2803PbF; DCE Part No: *
footprint SOT23 (SOT23, 3-Leads, Body 3.0x1.4mm (max), Pitch 0.95mm, IPC Medium Density)
pins: 1 G, 2 S, 3 D

## IRLML2803PbF_SOT23-DNF
designator Q?, comment value (IRLML2803PbF)  (hidden comment: IRLML2803PbF)
FET N-Channel 1.2A 30V - Do not Fit; Manufacturer: IRF; Part Number: DNF - IRLML2803PbF; EDM-PN: FET1; Package: SOT23; Text2: *; Text1: *; SAAB PN: *; DCE Part No: *
footprint SOT23 (SOT23, 3-Leads, Body 3.0x1.4mm (max), Pitch 0.95mm, IPC Medium Density)
pins: 1 G, 2 S, 3 D

## IRLML2803TRPbF_SOT23
designator Q?, comment IRLML2803TRPbF
FET N-Channel 1.2A 30V; Manufacturer: Infineon; EDM-PN: FET1; Package: SOT23; Text2: *; Text1: *; Value: IRLML2803TRPbF; SAAB PN: *; Part Number: IRLML2803TRPbF; DCE Part No: *
footprint SOT23 (SOT23, 3-Leads, Body 3.0x1.4mm (max), Pitch 0.95mm, IPC Medium Density)
pins: 1 G, 2 S, 3 D

## IRLML5103_SOT23
designator Q?, comment IRLML5103
FET P-Channel 610mA 30V; Manufacturer: IRF; EDM-PN: FET64; Package: SOT23; Text2: *; Text1: *; Value: IRLML5103; SAAB PN: *; Part Number: IRLML5103; DCE Part No: *
footprint SOT23 (SOT23, 3-Leads, Body 3.0x1.4mm (max), Pitch 0.95mm, IPC Medium Density)
pins: 1 G, 2 S, 3 D

## IRLML5103PbF_SOT23
designator Q?, comment IRLML5103PbF
FET P-Channel 610mA 30V; Manufacturer: IRF; Package: SOT23; EDM-PN: *; Text2: *; Text1: *; Value: IRLML5103PbF; SAAB PN: *; DCE Part No: *; Part Number: IRLML5103PbF
footprint SOT23 (SOT23, 3-Leads, Body 3.0x1.4mm (max), Pitch 0.95mm, IPC Medium Density)
pins: 1 G, 2 S, 3 D

## IRLML5203_SOT23
designator Q?, comment IRLML5203
FET P-Channel 2.4A 20V; Manufacturer: IRF; EDM-PN: FET61; Package: SOT23; Text2: *; Text1: *; Value: IRLML5203; SAAB PN: *; Part Number: IRLML5203; DCE Part No: *
footprint SOT23 (SOT23, 3-Leads, Body 3.0x1.4mm (max), Pitch 0.95mm, IPC Medium Density)
pins: 1 G, 2 S, 3 D

## IRLML6344TRPbF_SOT23
designator Q?, comment IRLML6344TRPbF
FET N-Channel 5A 30V; Manufacturer: IRF; Package: SOT23; EDM-PN: *; Text2: *; Text1: *; Value: IRLML6344TRPbF; Part Number: IRLML6344TRPbF; SAAB PN: *; DCE Part No: *
footprint SOT23 (SOT23, 3-Leads, Body 3.0x1.4mm (max), Pitch 0.95mm, IPC Medium Density)
pins: 1 G, 2 S, 3 D

## IRLML6401_SOT23
designator Q?, comment IRLML6401
FET P-Channel 3.4A 12V; Manufacturer: IRF; Package: SOT23; EDM-PN: *; Text2: *; Text1: *; Value: IRLML6401; SAAB PN: *; DCE Part No: *; Part Number: IRLML6401
footprint SOT23 (SOT23, 3-Leads, Body 3.0x1.4mm (max), Pitch 0.95mm, IPC Medium Density)
pins: 1 G, 2 S, 3 D

## IRLML6401PbF_SOT23
designator Q?, comment IRLML6401PbF
FET P-Channel 3.4A 12V; Manufacturer: IRF; Package: SOT23; EDM-PN: *; Text2: *; Text1: *; Value: IRLML6401PbF; SAAB PN: *; DCE Part No: *; Part Number: IRLML6401PbF
footprint SOT23 (SOT23, 3-Leads, Body 3.0x1.4mm (max), Pitch 0.95mm, IPC Medium Density)
pins: 1 G, 2 S, 3 D

## IRLML6401TRPBF_SOT23
designator Q?, comment Text1: IRLML6401  Text2: TRPBF  (hidden comment: IRLML6401TRPBF)
FET P-Channel 3.4A 12V; Manufacturer: IRF; DCE Part No: 6056; Package: SOT23; EDM-PN: *; Value: IRLML6401TRPBF; SAAB PN: *; Part Number: IRLML6401TRPBF
footprint SOT23 (SOT23, 3-Leads, Body 3.0x1.4mm (max), Pitch 0.95mm, IPC Medium Density)
pins: 1 G, 2 S, 3 D